# Altium footprint library THD Connectors-2.PcbLib: 84 footprints (part 5 of 6)
Each footprint in its own frame and in the unit in brackets; x right, y up, seen from the top. Pads: shape width x height; smd on the part's side, far side on the other; paste and mask are expansions set on the pad; w line width, h text height; cw(c..) or ccw(c..) is an arc to the next point about the centre after c.
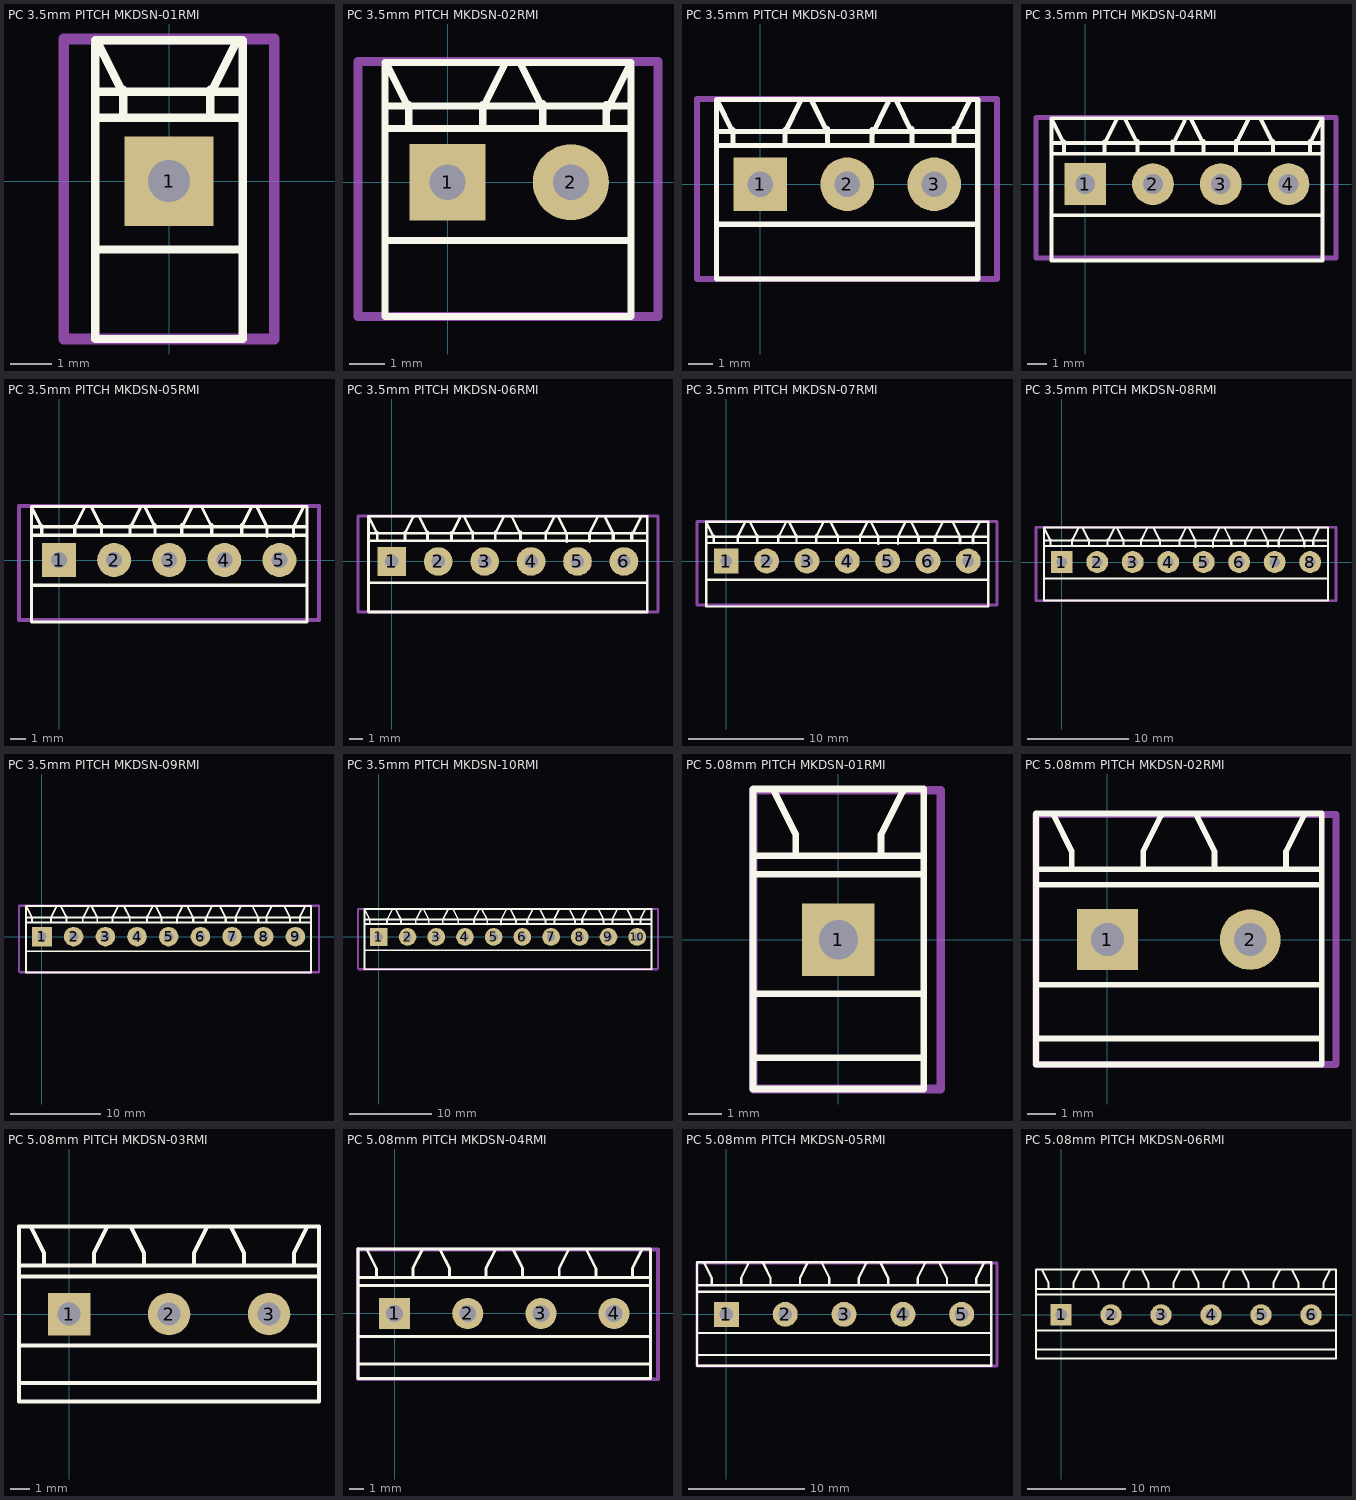
[diagram p4: the footprints below, top view; thin cyan lines are the x and y axes]

## PC 3.5mm PITCH MKDSN-01RMI [mil] "Phoenix Contact 3.5mm"
pads (1):
  rect 85x85 hole 40: 1(0,0)
Top Overlay:
  lines w8: -70,-65 70,-65 ; -70,60 70,60 ; -70,85 70,85 ; -70,130 -70,-150 70,-150 70,133.86 -70,133.86 ; -68.31,132.68 -43.31,82.68 ; -43.31,61.61 -43.31,86.61 ; 39.37,61.61 39.37,86.61 ; 39.37,82.68 64.37,132.68
Mechanical 15:
  lines w10: -100,-150 -100,135 100,135 100,-150 -100,-150
3D body "MKDSN-1RMI-35.STEP": height 338.96, standoff -139.45, extent -100.92,-153.82 100.93,137.52

## PC 3.5mm PITCH MKDSN-02RMI [mil] "Phoenix Contact 3.5mm"
pads (2):
  rect 85x85 hole 40: 1(0,0)
  round 85 hole 40: 2(137.8,0)
Top Overlay:
  lines w8: -70,-65 205,-65 ; -70,60 205,60 ; -70,85 205,85 ; -70,130 -70,-150 205,-150 205,130 ; -70,133.86 205,133.86 ; -68.31,132.68 -43.31,82.68 ; -43.31,61.61 -43.31,86.61 ; 39.37,61.61 39.37,86.61 ; 39.37,82.68 64.37,132.68 ; 81.3,132.68 106.3,82.68 ; 106.3,62.99 106.3,87.99 ; 177.17,61.61 177.17,86.61 ; 177.17,78.74 202.17,128.74
Mechanical 15:
  lines w10: 185,135 235,135 ; 235,135 -100,135 -100,-150 235,-150 235,135
3D body "MKDSN-2RMI-35.STEP": height 338.99, standoff -139.45, extent -100.93,-153.82 238.73,137.52

## PC 3.5mm PITCH MKDSN-03RMI [mil] "Phoenix Contact 3.5mm"
pads (3):
  rect 85x85 hole 40: 1(0,0)
  round 85 hole 40: 2(137.8,0) 3(275.59,0)
Top Overlay:
  lines w8: -68.9,-63.33 344.49,-63.33 ; -68.9,61.67 344.49,61.67 ; -68.9,83.33 344.49,83.33 ; -68.31,132.68 -43.31,82.68 ; -43.31,61.61 -43.31,86.61 ; 39.37,61.61 39.37,86.61 ; 39.37,82.68 64.37,132.68 ; 81.3,132.68 106.3,82.68 ; 106.3,62.99 106.3,87.99 ; 177.17,61.61 177.17,86.61 ; 177.17,78.74 202.17,128.74 ; 215.16,132.68 240.16,82.68 ; 240.16,62.99 240.16,87.99 ; 307.09,62.99 307.09,87.99 ; 307.09,82.68 332.09,132.68 ; -68.9,-150 -68.9,133.86 344.49,133.86 344.49,-150 -68.9,-150
Mechanical 15:
  lines w10: -100,-150 -100,135 375,135 375,-150 -100,-150
3D body "MKDSN-3RMI-35.STEP": height 338.99, standoff -139.45, extent -100.92,-153.82 376.52,137.52

## PC 3.5mm PITCH MKDSN-04RMI [mil] "Phoenix Contact 3.5mm"
pads (4):
  rect 85x85 hole 40: 1(0,0)
  round 85 hole 40: 2(137.8,0) 3(275.59,0) 4(413.39,0)
Top Overlay:
  lines w8: -68.9,-63.33 482.28,-63.33 ; -68.9,61.67 482.28,61.67 ; -68.9,83.33 482.28,83.33 ; -68.31,132.68 -43.31,82.68 ; -43.31,61.61 -43.31,86.61 ; 39.37,61.61 39.37,86.61 ; 39.37,82.68 64.37,132.68 ; 81.3,132.68 106.3,82.68 ; 106.3,62.99 106.3,87.99 ; 177.17,61.61 177.17,86.61 ; 177.17,78.74 202.17,128.74 ; 215.16,132.68 240.16,82.68 ; 240.16,62.99 240.16,87.99 ; 307.09,62.99 307.09,87.99 ; 307.09,82.68 332.09,132.68 ; 356.89,132.68 381.89,82.68 ; 381.89,62.99 381.89,87.99 ; 456.69,62.99 456.69,87.99 ; 456.69,82.68 481.69,132.68 ; -68.9,-155 482.28,-155 482.28,133.86 -68.9,133.86 -68.9,-155
Mechanical 15:
  lines w10: -100,-150 510,-150 510,135 -100,135 -100,-150
3D body "MKDSN-4RMI-35.STEP": height 338.99, standoff -139.45, extent -100.92,-153.82 514.32,137.52

## PC 3.5mm PITCH MKDSN-05RMI [mil] "Phoenix Contact 3.5mm"
pads (5):
  rect 85x85 hole 40: 1(0,0)
  round 85 hole 40: 2(137.8,0) 3(275.59,0) 4(413.39,0) 5(551.18,0)
Top Overlay:
  lines w8: -68.9,-63.33 620.08,-63.33 ; -68.9,61.67 620.08,61.67 ; -68.9,83.33 620.08,83.33 ; -68.31,132.68 -43.31,82.68 ; -43.31,61.61 -43.31,86.61 ; 39.37,61.61 39.37,86.61 ; 39.37,82.68 64.37,132.68 ; 81.3,132.68 106.3,82.68 ; 106.3,62.99 106.3,87.99 ; 177.17,61.61 177.17,86.61 ; 177.17,78.74 202.17,128.74 ; 215.16,132.68 240.16,82.68 ; 240.16,62.99 240.16,87.99 ; 307.09,62.99 307.09,87.99 ; 307.09,82.68 332.09,132.68 ; 356.89,132.68 381.89,82.68 ; 381.89,62.99 381.89,87.99 ; 456.69,62.99 456.69,87.99 ; 456.69,82.68 481.69,132.68 ; 494.69,132.68 519.68,82.68 ; 519.68,59.06 519.68,84.06 ; 586.61,59.06 586.61,84.06 ; 586.61,82.68 611.61,132.68 ; -68.9,-155 620.08,-155 620.08,133.86 -68.9,133.86 -68.9,-155
Mechanical 15:
  lines w10: -100,-150 650,-150 650,135 -100,135 -100,-150
3D body "MKDSN-5RMI-35.STEP": height 338.99, standoff -139.45, extent -100.94,-153.82 652.11,137.52

## PC 3.5mm PITCH MKDSN-06RMI [mil] "Phoenix Contact 3.5mm"
pads (6):
  rect 85x85 hole 40: 1(0,0)
  round 85 hole 40: 2(137.8,0) 3(275.59,0) 4(413.39,0) 5(551.18,0) 6(688.98,0)
Top Overlay:
  lines w8: -68.9,-63.33 757.87,-63.33 ; -68.9,61.67 757.87,61.67 ; -68.9,83.33 757.87,83.33 ; -68.31,132.68 -43.31,82.68 ; -43.31,61.61 -43.31,86.61 ; 39.37,61.61 39.37,86.61 ; 39.37,82.68 64.37,132.68 ; 81.3,132.68 106.3,82.68 ; 106.3,62.99 106.3,87.99 ; 177.17,61.61 177.17,86.61 ; 177.17,78.74 202.17,128.74 ; 215.16,132.68 240.16,82.68 ; 240.16,62.99 240.16,87.99 ; 307.09,62.99 307.09,87.99 ; 307.09,82.68 332.09,132.68 ; 356.89,132.68 381.89,82.68 ; 381.89,62.99 381.89,87.99 ; 456.69,62.99 456.69,87.99 ; 456.69,82.68 481.69,132.68 ; 494.69,132.68 519.68,82.68 ; 519.68,59.06 519.68,84.06 ; 586.61,59.06 586.61,84.06 ; 586.61,82.68 611.61,132.68 ; 632.87,131.9 657.87,81.9 ; 714.87,83.28 739.87,133.28 ; -68.9,-150 -68.9,133.86 757.87,133.86 757.87,-150 -68.9,-150
  lines w10: 657.48,65.6 657.48,83.33 ; 712.6,65.6 712.6,83.33
Mechanical 15:
  lines w10: -100,-150 790,-150 790,135 -100,135 -100,-150
3D body "MKDSN-6RMI-35.STEP": height 338.99, standoff -139.45, extent -100.91,-153.82 789.91,137.52

## PC 3.5mm PITCH MKDSN-07RMI [mil] "Phoenix Contact 3.5mm"
pads (7):
  rect 85x85 hole 40: 1(0,0)
  round 85 hole 40: 2(137.8,0) 3(275.59,0) 4(413.39,0) 5(551.18,0) 6(688.98,0) 7(826.77,0)
Top Overlay:
  lines w8: -68.9,-63.33 895.67,-63.33 ; -68.9,61.67 895.67,61.67 ; -68.9,83.33 895.67,83.33 ; -68.31,132.68 -43.31,82.68 ; -43.31,61.61 -43.31,86.61 ; 39.37,61.61 39.37,86.61 ; 39.37,82.68 64.37,132.68 ; 81.3,132.68 106.3,82.68 ; 106.3,62.99 106.3,87.99 ; 177.17,61.61 177.17,86.61 ; 177.17,78.74 202.17,128.74 ; 215.16,132.68 240.16,82.68 ; 240.16,62.99 240.16,87.99 ; 307.09,62.99 307.09,87.99 ; 307.09,82.68 332.09,132.68 ; 356.89,132.68 381.89,82.68 ; 381.89,62.99 381.89,87.99 ; 456.69,62.99 456.69,87.99 ; 456.69,82.68 481.69,132.68 ; 494.69,132.68 519.68,82.68 ; 519.68,59.06 519.68,84.06 ; 586.61,59.06 586.61,84.06 ; 586.61,82.68 611.61,132.68 ; 632.87,131.9 657.87,81.9 ; 714.87,83.28 739.87,133.28 ; 774.6,131.9 799.6,81.9 ; 840.85,83.28 865.85,133.28 ; -68.9,-155 895.67,-155 895.67,133.86 -68.9,133.86 -68.9,-155
  lines w10: 657.48,65.6 657.48,83.33 ; 712.6,65.6 712.6,83.33 ; 799.21,61.67 799.21,83.33 ; 842.52,61.67 842.52,83.33
Mechanical 15:
  lines w10: -100,-150 -100,135 925,135 925,-150 -100,-150
3D body "MKDSN-7RMI-35.STEP": height 338.99, standoff -139.45, extent -100.93,-153.82 927.7,137.52

## PC 3.5mm PITCH MKDSN-08RMI [mil] "Phoenix Contact 3.5mm"
pads (8):
  rect 85x85 hole 40: 1(0,0)
  round 85 hole 40: 2(137.8,0) 3(275.59,0) 4(413.39,0) 5(551.18,0) 6(688.98,0) 7(826.77,0) 8(964.57,0)
Top Overlay:
  lines w8: -68.9,-63.33 1033.46,-63.33 ; -68.9,61.67 1033.46,61.67 ; -68.9,83.33 1033.46,83.33 ; -68.31,132.68 -43.31,82.68 ; -43.31,61.61 -43.31,86.61 ; 39.37,61.61 39.37,86.61 ; 39.37,82.68 64.37,132.68 ; 81.3,132.68 106.3,82.68 ; 106.3,62.99 106.3,87.99 ; 177.17,61.61 177.17,86.61 ; 177.17,78.74 202.17,128.74 ; 215.16,132.68 240.16,82.68 ; 240.16,62.99 240.16,87.99 ; 307.09,62.99 307.09,87.99 ; 307.09,82.68 332.09,132.68 ; 356.89,132.68 381.89,82.68 ; 381.89,62.99 381.89,87.99 ; 456.69,62.99 456.69,87.99 ; 456.69,82.68 481.69,132.68 ; 494.69,132.68 519.68,82.68 ; 519.68,59.06 519.68,84.06 ; 586.61,59.06 586.61,84.06 ; 586.61,82.68 611.61,132.68 ; 632.87,131.9 657.87,81.9 ; 714.87,83.28 739.87,133.28 ; 774.6,131.9 799.6,81.9 ; 840.85,83.28 865.85,133.28 ; 916.33,131.9 941.33,81.9 ; 974.71,83.28 999.71,133.28 ; -68.9,-150 -68.9,133.86 1033.46,133.86 1033.46,-150 -68.9,-150
  lines w10: 657.48,65.6 657.48,83.33 ; 712.6,65.6 712.6,83.33 ; 799.21,61.67 799.21,83.33 ; 842.52,61.67 842.52,83.33 ; 940.94,61.67 940.94,83.33 ; 976.38,65.6 976.38,83.33
Mechanical 15:
  lines w10: -100,-150 -100,135 1065,135 1065,-150 -100,-150
3D body "MKDSN-8RMI-35.STEP": height 338.99, standoff -139.46, extent -100.92,-153.82 1065.5,137.52

## PC 3.5mm PITCH MKDSN-09RMI [mil] "Phoenix Contact 3.5mm"
pads (9):
  rect 85x85 hole 40: 1(0,0)
  round 85 hole 40: 2(137.8,0) 3(275.59,0) 4(413.39,0) 5(551.18,0) 6(688.98,0) 7(826.77,0) 8(964.57,0) 9(1102.36,0)
Top Overlay:
  lines w8: -68.9,-63.33 1170,-63.33 ; -68.9,61.67 1170,61.67 ; -68.9,83.33 1170,83.33 ; -68.31,132.68 -43.31,82.68 ; -43.31,61.61 -43.31,86.61 ; 39.37,61.61 39.37,86.61 ; 39.37,82.68 64.37,132.68 ; 81.3,132.68 106.3,82.68 ; 106.3,62.99 106.3,87.99 ; 177.17,61.61 177.17,86.61 ; 177.17,78.74 202.17,128.74 ; 215.16,132.68 240.16,82.68 ; 240.16,62.99 240.16,87.99 ; 307.09,62.99 307.09,87.99 ; 307.09,82.68 332.09,132.68 ; 356.89,132.68 381.89,82.68 ; 381.89,62.99 381.89,87.99 ; 456.69,62.99 456.69,87.99 ; 456.69,82.68 481.69,132.68 ; 494.69,132.68 519.68,82.68 ; 519.68,59.06 519.68,84.06 ; 586.61,59.06 586.61,84.06 ; 586.61,82.68 611.61,132.68 ; 632.87,131.9 657.87,81.9 ; 714.87,83.28 739.87,133.28 ; 774.6,131.9 799.6,81.9 ; 840.85,83.28 865.85,133.28 ; 916.33,131.9 941.33,81.9 ; 974.71,83.28 999.71,133.28 ; 1054.76,130.64 1079.76,80.64 ; 1120.14,82.8 1145.14,132.8 ; -68.9,-155 -68.9,133.86 1170,133.86 1170,-155 -68.9,-155
  lines w10: 657.48,65.6 657.48,83.33 ; 712.6,65.6 712.6,83.33 ; 799.21,61.67 799.21,83.33 ; 842.52,61.67 842.52,83.33 ; 940.94,61.67 940.94,83.33 ; 976.38,65.6 976.38,83.33 ; 1078.74,61.67 1078.74,83.33 ; 1122.05,61.67 1122.05,83.33
Mechanical 15:
  lines w10: -100,-150 -100,135 1205,135 1205,-155 -95,-155 -100,-150
3D body "MKDSN-9RMI-35.STEP": height 338.99, standoff -139.46, extent -100.91,-153.82 1203.3,137.52

## PC 3.5mm PITCH MKDSN-10RMI [mil] "Phoenix Contact 3.5mm"
pads (10):
  rect 85x85 hole 40: 1(0,0)
  round 85 hole 40: 2(137.8,0) 3(275.59,0) 4(413.39,0) 5(551.18,0) 6(688.98,0) 7(826.77,0) 8(964.57,0) 9(1102.36,0) 10(1240.16,0)
Top Overlay:
  lines w8: -68.9,-63.33 1309.06,-63.33 ; -68.9,61.67 1309.06,61.67 ; -68.9,83.33 1309.06,83.33 ; -68.31,132.68 -43.31,82.68 ; -43.31,61.61 -43.31,86.61 ; 39.37,61.61 39.37,86.61 ; 39.37,82.68 64.37,132.68 ; 81.3,132.68 106.3,82.68 ; 106.3,62.99 106.3,87.99 ; 177.17,61.61 177.17,86.61 ; 177.17,78.74 202.17,128.74 ; 215.16,132.68 240.16,82.68 ; 240.16,62.99 240.16,87.99 ; 307.09,62.99 307.09,87.99 ; 307.09,82.68 332.09,132.68 ; 356.89,132.68 381.89,82.68 ; 381.89,62.99 381.89,87.99 ; 456.69,62.99 456.69,87.99 ; 456.69,82.68 481.69,132.68 ; 494.69,132.68 519.68,82.68 ; 519.68,59.06 519.68,84.06 ; 586.61,59.06 586.61,84.06 ; 586.61,82.68 611.61,132.68 ; 632.87,131.9 657.87,81.9 ; 714.87,83.28 739.87,133.28 ; 774.6,131.9 799.6,81.9 ; 840.85,83.28 865.85,133.28 ; 916.33,131.9 941.33,81.9 ; 974.71,83.28 999.71,133.28 ; 1054.76,130.64 1079.76,80.64 ; 1120.14,82.8 1145.14,132.8 ; 1192.55,130.64 1217.55,80.64 ; 1254,82.8 1279,132.8 ; -68.9,-155 -68.9,133.86 1309.06,133.86 1309.06,-155 -68.9,-155
  lines w10: 657.48,65.6 657.48,83.33 ; 712.6,65.6 712.6,83.33 ; 799.21,61.67 799.21,83.33 ; 842.52,61.67 842.52,83.33 ; 940.94,61.67 940.94,83.33 ; 976.38,65.6 976.38,83.33 ; 1078.74,61.67 1078.74,83.33 ; 1122.05,61.67 1122.05,83.33 ; 1216.54,61.67 1216.54,83.33 ; 1255.91,61.67 1255.91,83.33
Mechanical 15:
  lines w10: -100,-150 -100,135 1340,135 1340,-150 1335,-155 -95,-155 -100,-150
3D body "MKDSN-10RMI-35.STEP": height 338.99, standoff -139.46, extent -100.92,-153.82 1341.09,137.52

## PC 5.08mm PITCH MKDSN-01RMI [mil] "Phoenix Contact 5.08mm"
pads (1):
  rect 85x85 hole 46: 1(0,0)
Top Overlay:
  lines w8: -100,-138.33 100,-138.33 ; -100,-63.33 100,-63.33 ; -100,76.67 100,76.67 ; -100,98.33 100,98.33 ; -100,175 -100,-175 100,-175 100,176.67 -100,176.67 ; -75,173.33 -50,123.33 -50,98.33 ; 50,98.33 50,123.33 75,173.33
Mechanical 15:
  lines w10: -100,-175 120,-175 120,175 -100,175 -100,-175
3D body "MKDSN-1RMI-5.08.STEP": height 531.5, standoff -137.79, extent -100,-177.16 121.65,177.17

## PC 5.08mm PITCH MKDSN-02RMI [mil] "Phoenix Contact 5.08mm"
pads (2):
  rect 85x85 hole 46: 1(0,0)
  round 85 hole 46: 2(200,0)
Top Overlay:
  lines w8: -100,-138.33 300,-138.33 ; -100,-63.33 300,-63.33 ; -100,76.67 300,76.67 ; -100,98.33 300,98.33 ; -100,175 -100,-175 300,-175 300,175 ; -100,176.67 300,176.67 ; -75,173.33 -50,123.33 -50,98.33 ; 50,98.33 50,123.33 75,173.33 ; 125,173.33 150,123.33 150,98.33 ; 250,98.33 250,123.33 275,173.33
Mechanical 15:
  lines w10: -100,-175 320,-175 320,175 -100,175 -100,-175
3D body "MKDSN-2RMI-5.08.STEP": height 531.52, standoff -137.79, extent -99.99,-177.17 321.65,177.16

## PC 5.08mm PITCH MKDSN-03RMI [mil] "Phoenix Contact 5.08"
pads (3):
  rect 85x85 hole 46: 1(0,0)
  round 85 hole 46: 2(200,0) 3(400,0)
Top Overlay:
  lines w8: -100,-138.33 500,-138.33 ; -100,-63.33 500,-63.33 ; -100,75 500,75 ; -100,96.67 500,96.67 ; -75,171.67 -50,121.67 -50,96.67 ; 50,96.67 50,121.67 75,171.67 ; 125,171.67 150,121.67 150,96.67 ; 250,96.67 250,121.67 275,171.67 ; 325,171.67 350,121.67 350,96.67 ; 450,96.67 450,121.67 475,171.67 ; -100,-175 -100,175 500,175 500,-175 -100,-175
3D body "MKDSN-3RMI-5.08.STEP": height 531.52, standoff -137.79, extent -100.03,-177.16 521.66,177.17

## PC 5.08mm PITCH MKDSN-04RMI [mil] "Phoenix Contact 5.08"
pads (4):
  rect 85x85 hole 46: 1(0,0)
  round 85 hole 46: 2(200,0) 3(400,0) 4(600,0)
Top Overlay:
  lines w8: -100,-138.33 700,-138.33 ; -100,-63.33 700,-63.33 ; -100,76.67 700,76.67 ; -100,98.33 700,98.33 ; -100,176.67 700,176.67 ; -100,177.17 -100,-177.16 700,-177.16 700,175 ; -75,173.33 -50,123.33 -50,98.33 ; 50,98.33 50,123.33 75,173.33 ; 125,173.33 150,123.33 150,98.33 ; 250,98.33 250,123.33 275,173.33 ; 325,173.33 350,123.33 350,98.33 ; 450,98.33 450,123.33 475,173.33 ; 525,173.33 550,123.33 550,98.33 ; 650,98.33 650,123.33 675,173.33
Mechanical 15:
  lines w10: -100,-180 -100,175 720,175 720,-180 -100,-180
3D body "MKDSN-4RMI-5.08.STEP": height 531.53, standoff -137.79, extent -100.03,-177.16 721.66,177.17

## PC 5.08mm PITCH MKDSN-05RMI [mil] "Phoenix Contact 5.08"
pads (5):
  rect 85x85 hole 46: 1(0,0)
  round 85 hole 46: 2(200,0) 3(400,0) 4(600,0) 5(800,0)
Top Overlay:
  lines w8: -100,-138.33 900,-138.33 ; -100,-63.33 900,-63.33 ; -100,76.67 900,76.67 ; -100,98.33 900,98.33 ; -100,176.67 900,176.67 ; -100,177.17 -100,-175 900,-175 900,175 ; -75,173.33 -50,123.33 -50,98.33 ; 50,98.33 50,123.33 75,173.33 ; 125,173.33 150,123.33 150,98.33 ; 250,98.33 250,123.33 275,173.33 ; 325,173.33 350,123.33 350,98.33 ; 450,98.33 450,123.33 475,173.33 ; 525,173.33 550,123.33 550,98.33 ; 650,98.33 650,123.33 675,173.33 ; 725,173.33 750,123.33 750,98.33 ; 850,98.33 850,123.33 875,173.33
Mechanical 15:
  lines w10: -100,-175 920,-175 920,175 -100,175 -100,-175
3D body "MKDSN-5RMI-5.08.STEP": height 531.53, standoff -137.79, extent -100,-177.16 921.65,177.17
3D body: height 36.42, standoff -40.55, extent 50,225 50,225

## PC 5.08mm PITCH MKDSN-06RMI [mil] "Phoenix Contact 5.08"
pads (6):
  rect 85x85 hole 46: 1(0,0)
  round 85 hole 46: 2(200,0) 3(400,0) 4(600,0) 5(800,0) 6(1000,0)
Top Overlay:
  lines w8: -100,-138.33 1100,-138.33 ; -100,-63.33 1100,-63.33 ; -100,81.67 1100,81.67 ; -100,103.33 1100,103.33 ; -100,177.17 -100,-175 1100,-175 1100,180 ; -100,181.67 1100,181.67 ; -75,178.33 -50,128.33 -50,103.33 ; 50,103.33 50,128.33 75,178.33 ; 125,178.33 150,128.33 150,103.33 ; 250,103.33 250,128.33 275,178.33 ; 325,178.33 350,128.33 350,103.33 ; 450,103.33 450,128.33 475,178.33 ; 525,178.33 550,128.33 550,103.33 ; 650,103.33 650,128.33 675,178.33 ; 725,178.33 750,128.33 750,103.33 ; 850,103.33 850,128.33 875,178.33 ; 925,178.33 950,128.33 950,103.33 ; 1050,103.33 1050,128.33 1075,178.33
3D body "MKDSN-6RMI-5.08.STEP": height 531.53, standoff -137.79, extent -100.01,-177.16 1121.65,177.17